# Altium footprint library devices.PCBLIB: 335 footprints (part 1 of 21)
Each footprint in its own frame and in the unit in brackets; x right, y up, seen from the top. Pads: shape width x height; smd on the part's side, far side on the other; paste and mask are expansions set on the pad; w line width, h text height; cw(c..) or ccw(c..) is an arc to the next point about the centre after c.
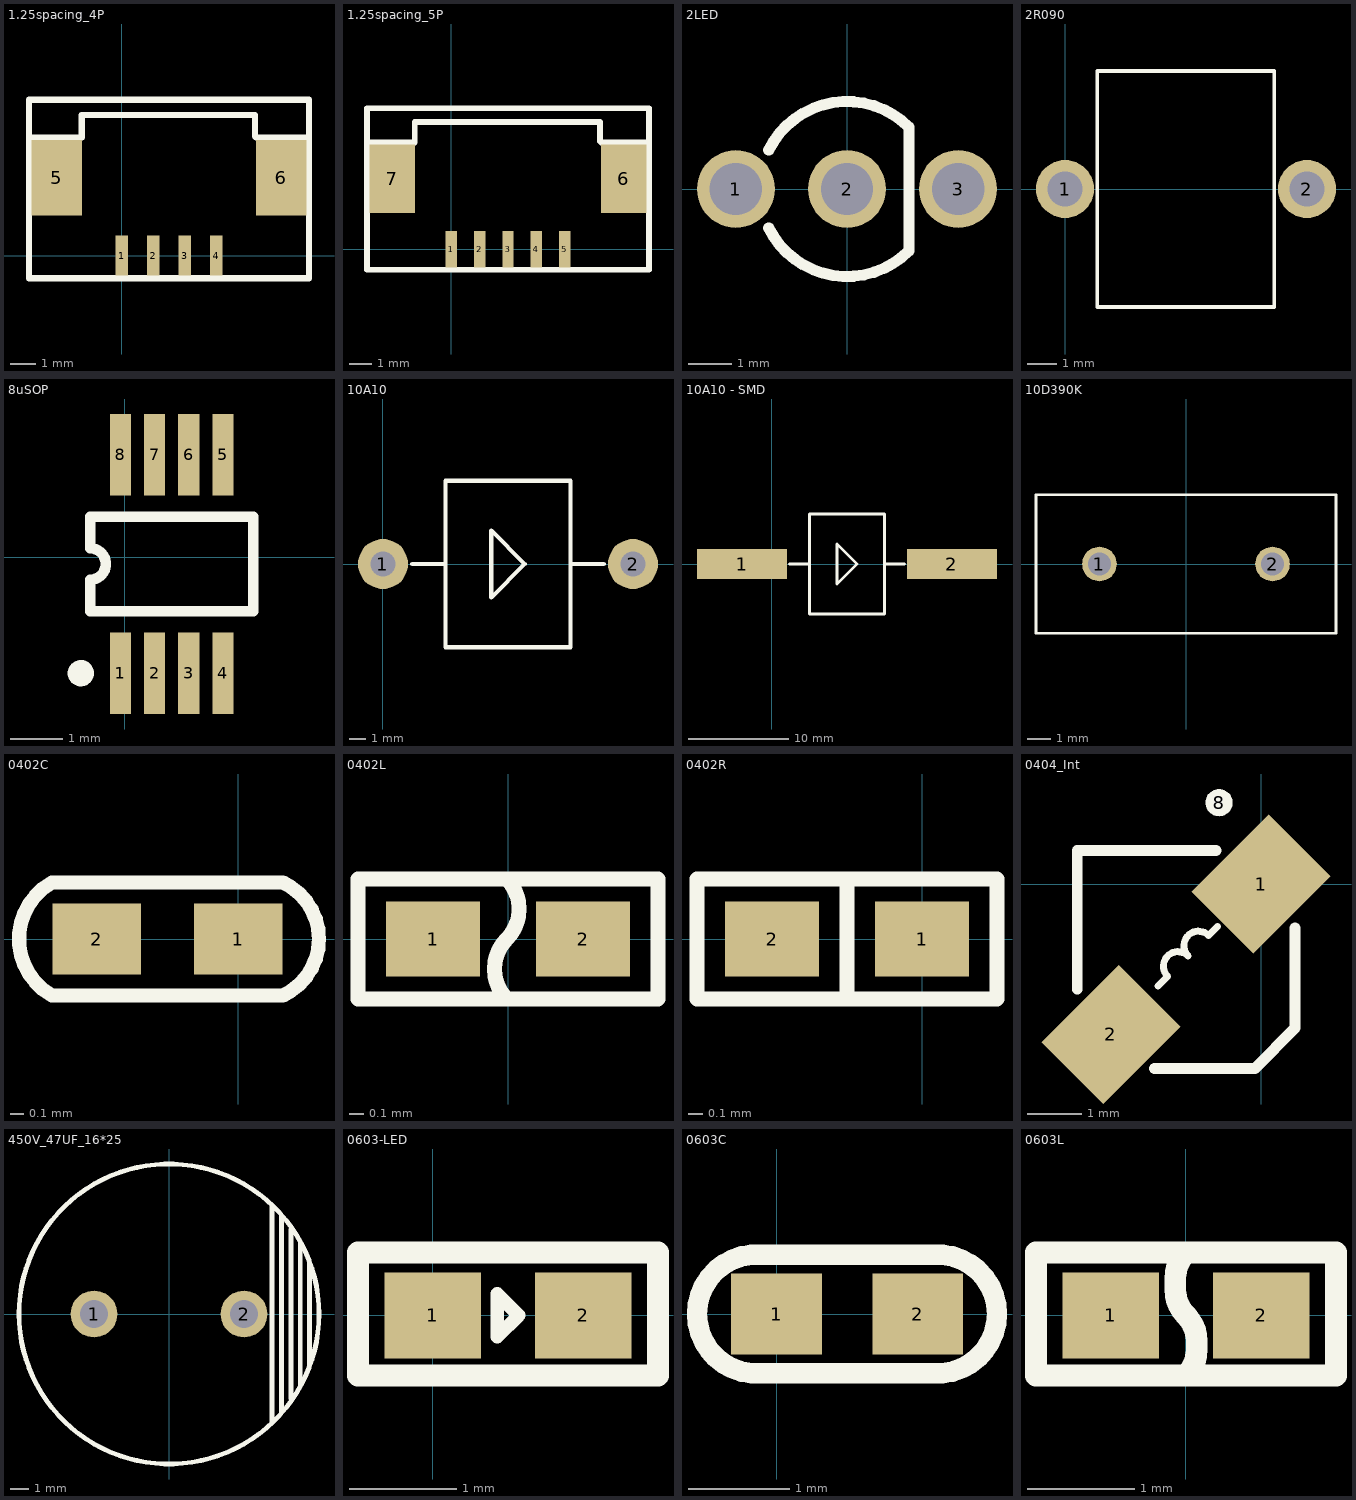
[diagram p0: the footprints below, top view; thin cyan lines are the x and y axes]

## 1.25spacing_4P [mm]
pads (6):
  rect 0.5x1.6 smd: 1(0,0) 2(1.25,0) 3(2.5,0) 4(3.75,0)
  rect 2x3 smd: 5(-2.6,3.1) 6(6.35,3.1)
Top Overlay:
  lines w0.254: -3.7,4.7 -3.7,6.2 7.45,6.2 7.45,4.7 ; -3.7,4.7 -1.6,4.7 -1.6,5.6 5.3,5.6 5.3,4.75 5.35,4.7 7.45,4.7 ; -3.7,4.7 -3.7,-0.9 7.45,-0.9 7.45,4.7

## 1.25spacing_5P [mm]
pads (7):
  rect 0.5x1.6 smd: 1(0,0) 2(1.25,0) 3(2.5,0) 4(3.75,0) 5(5,0)
  rect 2x3 smd: 6(7.6,3.1) 7(-2.6,3.1)
Top Overlay:
  lines w0.254: -3.7,4.7 -3.7,-0.9 8.7,-0.9 8.7,4.7 ; -3.7,4.7 -1.6,4.7 -1.6,5.6 6.55,5.6 6.55,4.75 6.6,4.7 8.7,4.7 ; -3.7,4.7 -3.7,6.2 8.7,6.2 8.7,4.7

## 2LED [mil]
pads (3):
  round 70 hole 47.24: 1(-100,0) 2(0,0) 3(100,0)
Top Overlay:
  lines w10: -70.43,-35.21 ccw(c0,0) 55.68,-55.68 55.68,55.68 ccw(c0,0) -70.43,35.21

## 2R090 [mm]
pads (2):
  round 2 hole 1.2: 1(0,0) 2(8.333,0)
Top Overlay:
  lines w0.127: 1.105,-4.064 1.105,4.064 7.201,4.064 7.201,-4.064 1.105,-4.064

## 8uSOP [mm]
pads (8):
  rect 0.4x1.55 smd: 1(-0.086,-2.202) 2(0.564,-2.202) 3(1.214,-2.202) 4(1.864,-2.202) 5(1.864,1.948) 6(1.214,1.948) 7(0.564,1.948) 8(-0.086,1.948)
Top Overlay:
  circle w0.25: c-0.836,-2.202 r0.125
  lines w0.2: -0.661,-1.027 2.439,-1.027 2.439,0.773 -0.661,0.773 -0.661,0.173 cw(c-0.661,-0.127) -0.661,-0.427 -0.661,-1.027

## 10A10 [mm]
pads (2):
  round 3 hole 1.5: 1(0,0) 2(15,0)
Top Overlay:
  lines w0.254: 1.75,0 3.75,0 ; 11.25,0 13.25,0 ; 3.75,-5 3.75,5 11.25,5 11.25,-5 3.75,-5 ; 6.5,-2 6.5,2 8.5,0 6.5,-2

## 10A10 - SMD [mm]
pads (2):
  rect 9x3 smd: 1(-3,0) 2(18,0)
Top Overlay:
  lines w0.254: 1.75,0 3.75,0 ; 11.25,0 13.25,0 ; 3.75,-5 3.75,5 11.25,5 11.25,-5 3.75,-5 ; 6.5,-2 6.5,2 8.5,0 6.5,-2

## 10D390K [mm]
pads (2):
  round 1.5 hole 1: 1(-3.75,0) 2(3.75,0)
Top Overlay:
  lines w0.127: -6.5,-3 -6.5,0 -6.5,3 6.5,3 6.5,-3 -6.5,-3

## 0402C [mil]
pads (2):
  rect 25x20 smd: 1(0,0) 2(-40,0)
Top Overlay:
  lines w4: -52.71,-16 cw(c-43.59,0) -52.71,16 12.56,16 cw(c5.2,0) 12.56,-16 -52.71,-16
3D body: height 19.29, standoff 0, extent -37.84,-9.84 1.53,9.84

## 0402L [mil]
pads (2):
  rect 25x20 smd: 1(-20,0) 2(20,0)
Top Overlay:
  lines w4: -0.31,-16 cw(c7.68,-8) -0.31,0 ccw(c-8.31,8) -0.32,16 ; -40,-16 40,-16 40,16 -40,16 -40,-16
3D body: height 9.84, standoff -9.84, extent -19.69,-12 19.69,11.62

## 0402R [mil]
pads (2):
  rect 25x20 smd: 1(0,0) 2(-40,0)
Top Overlay:
  lines w4: -20,-15.75 -20,15.75 ; -60,-16 -60,16 20,16 20,-16 -60,-16
3D body: height 13.78, standoff 0, extent -39.68,-9.84 -0.31,9.84

## 0404_Int [mm]
pads (3):
  rect 1.6x2 smd rot 135: 1(0,0) 2(-2.75,-2.75)
  round 0.5 on Top Overlay: 8(-0.77,1.49)
Top Overlay:
  lines w0.127: -1.888,-1.868 -1.711,-1.69 cw(c-1.523,-1.503) -1.336,-1.315 ; -0.796,-0.776 -0.96,-0.94 ccw(c-1.148,-1.128) -1.335,-1.315 ; -1.336,-1.315 -1.335,-1.315
  lines w0.2: -3.365,-1.925 -3.365,0.615 -0.825,0.615 ; -1.95,-3.373 -0.114,-3.373 0.623,-2.636 0.623,-0.8

## 450V_47UF_16*25 [mm]
pads (2):
  round 2.5 hole 1.5: 1(-4,0) 2(4,0)
Top Overlay:
  circle w0.254: c0,0 r8
  lines w0.254: 5.5,-5.75 5.5,5.75 ; 6,-5.25 6,5.25 ; 6.5,-4.5 6.5,4.5 ; 7,-3.75 7,3.75 ; 7.5,-2.75 7.5,2.75

## 0603-LED [mm]
pads (2):
  rect 0.9x0.8 smd: 1(0,0) 2(1.4,0)
Top Overlay:
  lines w0.127: 0.6,-0.2 0.8,0 0.6,0.2 0.6,-0.2
  lines w0.203: -0.697,-0.559 -0.697,0.584 2.097,0.584 2.097,-0.559 -0.697,-0.559

## 0603C [mm]
pads (2):
  rect 0.9x0.8 smd: 1(0,0) 2(1.4,0)
Top Overlay:
  lines w0.203: -0.249,0.587 ccw(c-0.2,0) -0.248,-0.587 1.645,-0.587 ccw(c1.597,0) 1.646,0.587 -0.249,0.587
3D body: height 0.89, standoff -0.01, extent -0.601,-0.544 1.999,0.456

## 0603L [mm]
pads (2):
  rect 0.9x0.8 smd: 1(-0.7,0) 2(0.7,0)
Top Overlay:
  lines w0.203: 0,-0.559 ccw(c-0.241,-0.317) 0.1,-0.317 0.1,-0.241 ccw(c-0.241,-0.241) 0,0 cw(c0.241,0.241) -0.1,0.241 -0.1,0.343 cw(c0.241,0.343) 0,0.584 ; -1.397,-0.559 1.397,-0.559 1.397,0.584 -1.397,0.584 -1.397,-0.559